# Altium schematic symbol library 场效应管.SchLib: 1062 symbols (part 3 of 4) (continued)
## MTP5P06V (continued)

## MTP6N60E
designator Q?
N-Channel MOSFET
simulation model MTP6N60E (SUBCKT)
pins: 1 D (in), 2 G (in), 3 S (in)
1 alternate drawing of the same symbol

## MTP6P20E
designator Q?
P-Channel MOSFET
simulation model MTP6P20E (SUBCKT)
pins: 1 D (in), 2 G (in), 3 S (in)
1 alternate drawing of the same symbol

## MTP7N20E
designator Q?
N-Channel MOSFET
simulation model MTP7N20E (SUBCKT)
pins: 1 D (in), 2 G (in), 3 S (in)
1 alternate drawing of the same symbol

## MTP8N50E
designator Q?
N-Channel MOSFET
simulation model MTP8N50E (SUBCKT)
pins: 1 D (in), 2 G (in), 3 S (in)
1 alternate drawing of the same symbol

## MTP9N25E
designator Q?
N-Channel MOSFET
simulation model MTP9N25E (SUBCKT)
pins: 1 D (in), 2 G (in), 3 S (in)
1 alternate drawing of the same symbol

## MTP10N10E
designator Q?
N-Channel MOSFET
simulation model MTP10N10E (SUBCKT)
pins: 1 D (in), 2 G (in), 3 S (in)
1 alternate drawing of the same symbol

## MTP10N10EL
designator Q?
N-Channel MOSFET
simulation model MTP10N10EL (SUBCKT)
pins: 1 D (in), 2 G (in), 3 S (in)
1 alternate drawing of the same symbol

## MTP10N40E
designator Q?
N-Channel MOSFET
simulation model MTP10N40E (SUBCKT)
pins: 1 D (in), 2 G (in), 3 S (in)
1 alternate drawing of the same symbol

## MTP12N10E
designator Q?
N-Channel MOSFET
simulation model MTP12N10E (SUBCKT)
pins: 1 D (in), 2 G (in), 3 S (in)
1 alternate drawing of the same symbol

## MTP12P10
designator Q?
P-Channel MOSFET
simulation model MTP12P10 (SUBCKT)
pins: 1 D (in), 2 G (in), 3 S (in)
1 alternate drawing of the same symbol

## MTP15N06V
designator Q?
N-Channel MOSFET
simulation model MTP15N06V (SUBCKT)
pins: 1 D (in), 2 G (in), 3 S (in)
1 alternate drawing of the same symbol

## MTP15N06VL
designator Q?
N-Channel MOSFET
simulation model MTP15N06VL (SUBCKT)
pins: 1 D (in), 2 G (in), 3 S (in)
1 alternate drawing of the same symbol

## MTP16N25E
designator Q?
N-Channel MOSFET
simulation model MTP16N25E (SUBCKT)
pins: 1 D (in), 2 G (in), 3 S (in)
1 alternate drawing of the same symbol

## MTP20N06V
designator Q?
N-Channel MOSFET
simulation model MTP20N06V (SUBCKT)
pins: 1 D (in), 2 G (in), 3 S (in)
1 alternate drawing of the same symbol

## MTP20N20E
designator Q?
N-Channel MOSFET
simulation model MTP20N20E (SUBCKT)
pins: 1 D (in), 2 G (in), 3 S (in)
1 alternate drawing of the same symbol

## MTP23P06V
designator Q?
P-Channel MOSFET
simulation model MTP23P06V (SUBCKT)
pins: 1 D (in), 2 G (in), 3 S (in)
1 alternate drawing of the same symbol

## MTP27N10E
designator Q?
N-Channel MOSFET
simulation model MTP27N10E (SUBCKT)
pins: 1 D (in), 2 G (in), 3 S (in)
1 alternate drawing of the same symbol

## MTP30N06VL
designator Q?
N-Channel MOSFET
simulation model MTP30N06VL (SUBCKT)
pins: 1 D (in), 2 G (in), 3 S (in)
1 alternate drawing of the same symbol

## MTP30P06V
designator Q?
P-Channel MOSFET
simulation model MTP30P06V (SUBCKT)
pins: 1 D (in), 2 G (in), 3 S (in)
1 alternate drawing of the same symbol

## MTP33N10E
designator Q?
N-Channel MOSFET
simulation model MTP33N10E (SUBCKT)
pins: 1 D (in), 2 G (in), 3 S (in)
1 alternate drawing of the same symbol

## MTP35N06ZL
designator Q?
N-Channel MOSFET
simulation model MTP35N06ZL (SUBCKT)
pins: 1 D (in), 2 G (in), 3 S (in)
1 alternate drawing of the same symbol

## MTP36N06V
designator Q?
N-Channel MOSFET
simulation model MTP36N06V (SUBCKT)
pins: 1 D (in), 2 G (in), 3 S (in)
1 alternate drawing of the same symbol

## MTP50P03HDL
designator Q?
P-Channel MOSFET
simulation model MTP50P03HDL (SUBCKT)
pins: 1 D (in), 2 G (in), 3 S (in)
1 alternate drawing of the same symbol

## MTP52N06V
designator Q?
N-Channel MOSFET
simulation model MTP52N06V (SUBCKT)
pins: 1 D (in), 2 G (in), 3 S (in)
1 alternate drawing of the same symbol

## MTP52N06VL
designator Q?
N-Channel MOSFET
simulation model MTP52N06VL (SUBCKT)
pins: 1 D (in), 2 G (in), 3 S (in)
1 alternate drawing of the same symbol

## MTP55N06Z
designator Q?
N-Channel MOSFET
simulation model MTP55N06Z (SUBCKT)
pins: 1 D (in), 2 G (in), 3 S (in)
1 alternate drawing of the same symbol

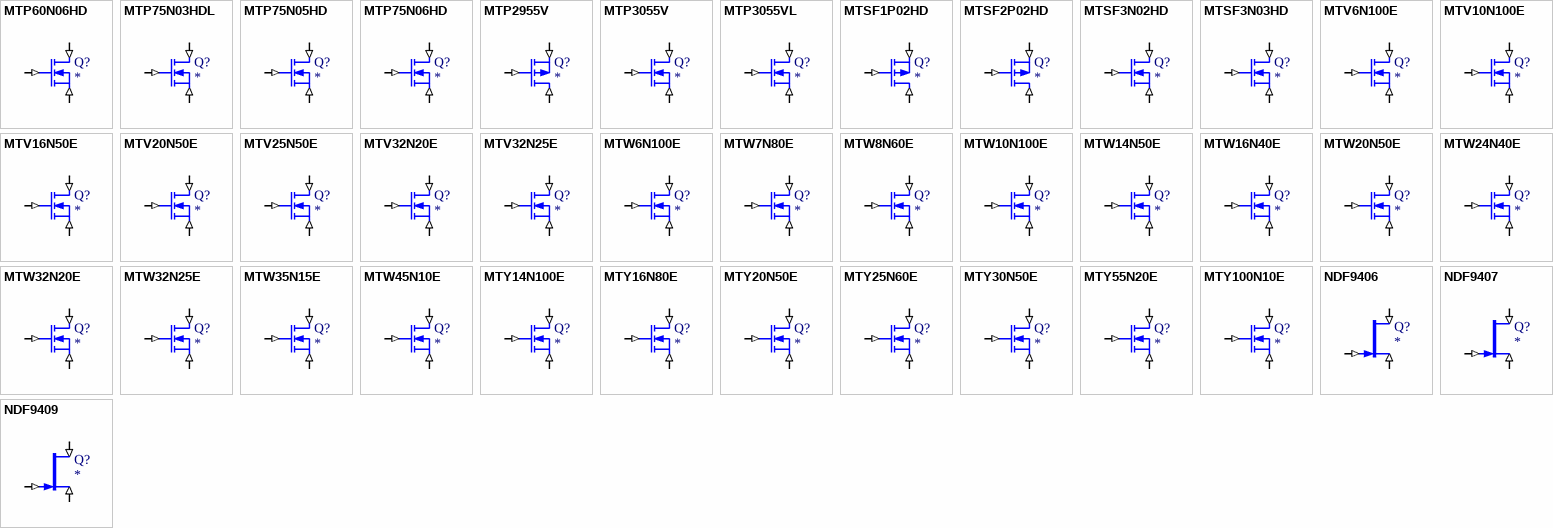
[diagram p21: symbols MTP60N06HD to NDF9409]

## MTP60N06HD
designator Q?
N-Channel MOSFET
simulation model MTP60N06HD (SUBCKT)
pins: 1 D (in), 2 G (in), 3 S (in)
1 alternate drawing of the same symbol

## MTP75N03HDL
designator Q?
N-Channel MOSFET
simulation model MTP75N03HDL (SUBCKT)
pins: 1 D (in), 2 G (in), 3 S (in)
1 alternate drawing of the same symbol

## MTP75N05HD
designator Q?
N-Channel MOSFET
simulation model MTP75N05HD (SUBCKT)
pins: 1 D (in), 2 G (in), 3 S (in)
1 alternate drawing of the same symbol

## MTP75N06HD
designator Q?
N-Channel MOSFET
simulation model MTP75N06HD (SUBCKT)
pins: 1 D (in), 2 G (in), 3 S (in)
1 alternate drawing of the same symbol

## MTP2955V
designator Q?
P-Channel MOSFET
simulation model MTP2955V (SUBCKT)
pins: 1 D (in), 2 G (in), 3 S (in)
1 alternate drawing of the same symbol

## MTP3055V
designator Q?
N-Channel MOSFET
simulation model MTP3055V (SUBCKT)
pins: 1 D (in), 2 G (in), 3 S (in)
1 alternate drawing of the same symbol

## MTP3055VL
designator Q?
N-Channel MOSFET
simulation model MTP3055VL (SUBCKT)
pins: 1 D (in), 2 G (in), 3 S (in)
1 alternate drawing of the same symbol

## MTSF1P02HD
designator Q?
P-Channel MOSFET
simulation model MTSF1P02HD (SUBCKT)
pins: 1 D (in), 2 G (in), 3 S (in)
1 alternate drawing of the same symbol

## MTSF2P02HD
designator Q?
P-Channel MOSFET
simulation model MTSF2P02HD (SUBCKT)
pins: 1 D (in), 2 G (in), 3 S (in)
1 alternate drawing of the same symbol

## MTSF3N02HD
designator Q?
N-Channel MOSFET
simulation model MTSF3N02HD (SUBCKT)
pins: 1 D (in), 2 G (in), 3 S (in)
1 alternate drawing of the same symbol

## MTSF3N03HD
designator Q?
N-Channel MOSFET
simulation model MTSF3N03HD (SUBCKT)
pins: 1 D (in), 2 G (in), 3 S (in)
1 alternate drawing of the same symbol

## MTV6N100E
designator Q?
N-Channel MOSFET
simulation model MTV6N100E (SUBCKT)
pins: 1 D (in), 2 G (in), 3 S (in)
1 alternate drawing of the same symbol

## MTV10N100E
designator Q?
N-Channel MOSFET
simulation model MTV10N100E (SUBCKT)
pins: 1 D (in), 2 G (in), 3 S (in)
1 alternate drawing of the same symbol

## MTV16N50E
designator Q?
N-Channel MOSFET
simulation model MTV16N50E (SUBCKT)
pins: 1 D (in), 2 G (in), 3 S (in)
1 alternate drawing of the same symbol

## MTV20N50E
designator Q?
N-Channel MOSFET
simulation model MTV20N50E (SUBCKT)
pins: 1 D (in), 2 G (in), 3 S (in)
1 alternate drawing of the same symbol

## MTV25N50E
designator Q?
N-Channel MOSFET
simulation model MTV25N50E (SUBCKT)
pins: 1 D (in), 2 G (in), 3 S (in)
1 alternate drawing of the same symbol

## MTV32N20E
designator Q?
N-Channel MOSFET
simulation model MTV32N20E (SUBCKT)
pins: 1 D (in), 2 G (in), 3 S (in)
1 alternate drawing of the same symbol

## MTV32N25E
designator Q?
N-Channel MOSFET
simulation model MTV32N25E (SUBCKT)
pins: 1 D (in), 2 G (in), 3 S (in)
1 alternate drawing of the same symbol

## MTW6N100E
designator Q?
N-Channel MOSFET
simulation model MTW6N100E (SUBCKT)
pins: 1 D (in), 2 G (in), 3 S (in)
1 alternate drawing of the same symbol

## MTW7N80E
designator Q?
N-Channel MOSFET
simulation model MTW7N80E (SUBCKT)
pins: 1 D (in), 2 G (in), 3 S (in)
1 alternate drawing of the same symbol

## MTW8N60E
designator Q?
N-Channel MOSFET
simulation model MTW8N60E (SUBCKT)
pins: 1 D (in), 2 G (in), 3 S (in)
1 alternate drawing of the same symbol

## MTW10N100E
designator Q?
N-Channel MOSFET
simulation model MTW10N100E (SUBCKT)
pins: 1 D (in), 2 G (in), 3 S (in)
1 alternate drawing of the same symbol

## MTW14N50E
designator Q?
N-Channel MOSFET
simulation model MTW14N50E (SUBCKT)
pins: 1 D (in), 2 G (in), 3 S (in)
1 alternate drawing of the same symbol

## MTW16N40E
designator Q?
N-Channel MOSFET
simulation model MTW16N40E (SUBCKT)
pins: 1 D (in), 2 G (in), 3 S (in)
1 alternate drawing of the same symbol

## MTW20N50E
designator Q?
N-Channel MOSFET
simulation model MTW20N50E (SUBCKT)
pins: 1 D (in), 2 G (in), 3 S (in)
1 alternate drawing of the same symbol

## MTW24N40E
designator Q?
N-Channel MOSFET
simulation model MTW24N40E (SUBCKT)
pins: 1 D (in), 2 G (in), 3 S (in)
1 alternate drawing of the same symbol

## MTW32N20E
designator Q?
N-Channel MOSFET
simulation model MTW32N20E (SUBCKT)
pins: 1 D (in), 2 G (in), 3 S (in)
1 alternate drawing of the same symbol

## MTW32N25E
designator Q?
N-Channel MOSFET
simulation model MTW32N25E (SUBCKT)
pins: 1 D (in), 2 G (in), 3 S (in)
1 alternate drawing of the same symbol

## MTW35N15E
designator Q?
N-Channel MOSFET
simulation model MTW35N15E (SUBCKT)
pins: 1 D (in), 2 G (in), 3 S (in)
1 alternate drawing of the same symbol

## MTW45N10E
designator Q?
N-Channel MOSFET
simulation model MTW45N10E (SUBCKT)
pins: 1 D (in), 2 G (in), 3 S (in)
1 alternate drawing of the same symbol

## MTY14N100E
designator Q?
N-Channel MOSFET
simulation model MTY14N100E (SUBCKT)
pins: 1 D (in), 2 G (in), 3 S (in)
1 alternate drawing of the same symbol

## MTY16N80E
designator Q?
N-Channel MOSFET
simulation model MTY16N80E (SUBCKT)
pins: 1 D (in), 2 G (in), 3 S (in)
1 alternate drawing of the same symbol

## MTY20N50E
designator Q?
N-Channel MOSFET
simulation model MTY20N50E (SUBCKT)
pins: 1 D (in), 2 G (in), 3 S (in)
1 alternate drawing of the same symbol

## MTY25N60E
designator Q?
N-Channel MOSFET
simulation model MTY25N60E (SUBCKT)
pins: 1 D (in), 2 G (in), 3 S (in)
1 alternate drawing of the same symbol

## MTY30N50E
designator Q?
N-Channel MOSFET
simulation model MTY30N50E (SUBCKT)
pins: 1 D (in), 2 G (in), 3 S (in)
1 alternate drawing of the same symbol

## MTY55N20E
designator Q?
N-Channel MOSFET
simulation model MTY55N20E (SUBCKT)
pins: 1 D (in), 2 G (in), 3 S (in)
1 alternate drawing of the same symbol

## MTY100N10E
designator Q?
N-Channel MOSFET
simulation model MTY100N10E (SUBCKT)
pins: 1 D (in), 2 G (in), 3 S (in)
1 alternate drawing of the same symbol

## NDF9406
designator Q?
N-Channel JFET
simulation model NDF9406 (NJFET)
pins: 1 D (in), 2 G (in), 3 S (in)
1 alternate drawing of the same symbol

## NDF9407
designator Q?
N-Channel JFET
simulation model NDF9407 (NJFET)
pins: 1 D (in), 2 G (in), 3 S (in)
1 alternate drawing of the same symbol

## NDF9409
designator Q?
N-Channel JFET
simulation model NDF9409 (NJFET)
pins: 1 D (in), 2 G (in), 3 S (in)
1 alternate drawing of the same symbol

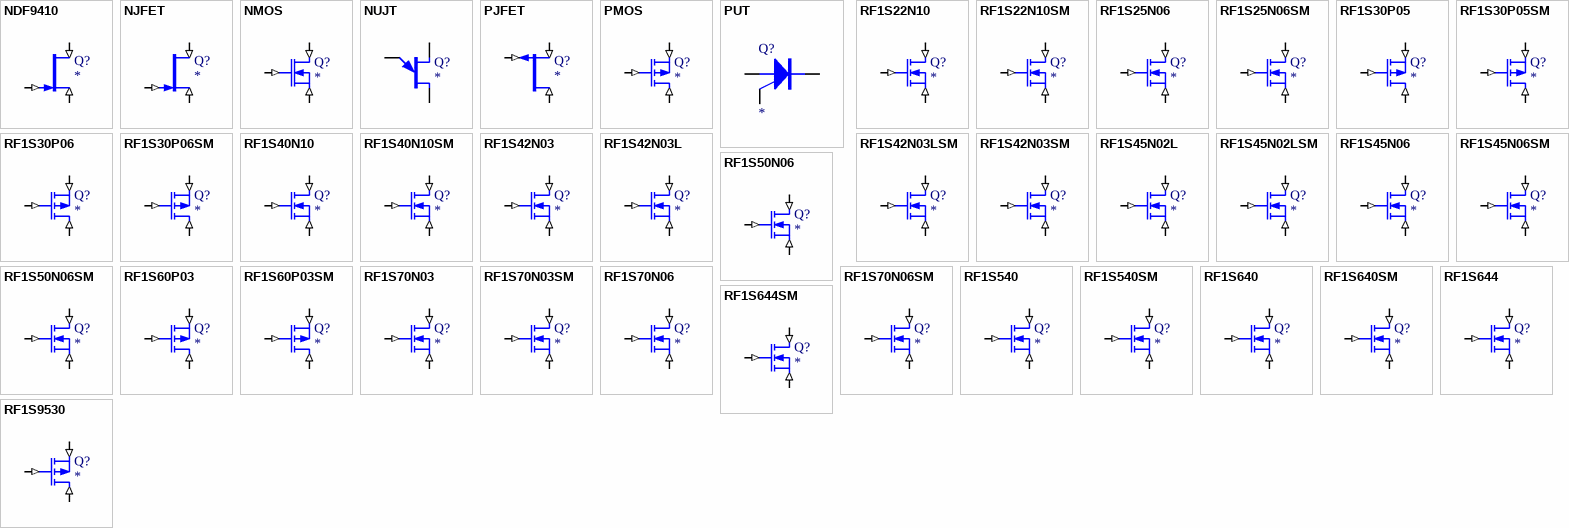
[diagram p22: symbols NDF9410 to RF1S9530]

## NDF9410
designator Q?
N-Channel JFET
simulation model NDF9410 (NJFET)
pins: 1 D (in), 2 G (in), 3 S (in)
1 alternate drawing of the same symbol

## NJFET
designator Q?
N-Channel JFET
simulation model NJFET
pins: 1 D (in), 2 G (in), 3 S (in)
1 alternate drawing of the same symbol

## NMOS
designator Q?
N-Channel MOSFET; TEMP: *
simulation model NMOS (NEMOS)
pins: 1 D (in), 2 G (in), 3 S (in)
1 alternate drawing of the same symbol

## NUJT
designator Q?
Unijunction Transistor
simulation model NUJT (SUBCKT)
pins: 1 B2, 2 E, 3 B1
1 alternate drawing of the same symbol

## PJFET
designator Q?
P-Channel JFET
simulation model PJFET
pins: 1 D (in), 2 G (in), 3 S (in)
1 alternate drawing of the same symbol

## PMOS
designator Q?
P-Channel MOSFET; TEMP: *
simulation model PMOS (PEMOS)
pins: 1 D (in), 2 G (in), 3 S (in)
1 alternate drawing of the same symbol

## PUT
designator Q?
Programmable Unijunction Transistor
simulation model PUT (SUBCKT)
pins: 1 A, 2 G, 3 K
1 alternate drawing of the same symbol

## RF1S22N10
designator Q?
N-Channel MOSFET
simulation model RF1S22N10 (SUBCKT)
pins: 1 D (in), 2 G (in), 3 S (in)
1 alternate drawing of the same symbol

## RF1S22N10SM
designator Q?
N-Channel MOSFET
simulation model RF1S22N10SM (SUBCKT)
pins: 1 D (in), 2 G (in), 3 S (in)
1 alternate drawing of the same symbol

## RF1S25N06
designator Q?
N-Channel MOSFET
simulation model RF1S25N06 (SUBCKT)
pins: 1 D (in), 2 G (in), 3 S (in)
1 alternate drawing of the same symbol

## RF1S25N06SM
designator Q?
N-Channel MOSFET
simulation model RF1S25N06SM (SUBCKT)
pins: 1 D (in), 2 G (in), 3 S (in)
1 alternate drawing of the same symbol

## RF1S30P05
designator Q?
P-Channel MOSFET
simulation model RF1S30P05 (SUBCKT)
pins: 1 D (in), 2 G (in), 3 S (in)
1 alternate drawing of the same symbol

## RF1S30P05SM
designator Q?
P-Channel MOSFET
simulation model RF1S30P05SM (SUBCKT)
pins: 1 D (in), 2 G (in), 3 S (in)
1 alternate drawing of the same symbol

## RF1S30P06
designator Q?
P-Channel MOSFET
simulation model RF1S30P06 (SUBCKT)
pins: 1 D (in), 2 G (in), 3 S (in)
1 alternate drawing of the same symbol

## RF1S30P06SM
designator Q?
P-Channel MOSFET
simulation model RF1S30P06SM (SUBCKT)
pins: 1 D (in), 2 G (in), 3 S (in)
1 alternate drawing of the same symbol

## RF1S40N10
designator Q?
N-Channel MOSFET
simulation model RF1S40N10 (SUBCKT)
pins: 1 D (in), 2 G (in), 3 S (in)
1 alternate drawing of the same symbol

## RF1S40N10SM
designator Q?
N-Channel MOSFET
simulation model RF1S40N10SM (SUBCKT)
pins: 1 D (in), 2 G (in), 3 S (in)
1 alternate drawing of the same symbol

## RF1S42N03
designator Q?
N-Channel MOSFET
simulation model RF1S42N03 (SUBCKT)
pins: 1 D (in), 2 G (in), 3 S (in)
1 alternate drawing of the same symbol

## RF1S42N03L
designator Q?
N-Channel MOSFET
simulation model RF1S42N03L (SUBCKT)
pins: 1 D (in), 2 G (in), 3 S (in)
1 alternate drawing of the same symbol

## RF1S42N03LSM
designator Q?
N-Channel MOSFET
simulation model RF1S42N03LSM (SUBCKT)
pins: 1 D (in), 2 G (in), 3 S (in)
1 alternate drawing of the same symbol

## RF1S42N03SM
designator Q?
N-Channel MOSFET
simulation model RF1S42N03SM (SUBCKT)
pins: 1 D (in), 2 G (in), 3 S (in)
1 alternate drawing of the same symbol

## RF1S45N02L
designator Q?
N-Channel MOSFET
simulation model RF1S45N02L (SUBCKT)
pins: 1 D (in), 2 G (in), 3 S (in)
1 alternate drawing of the same symbol

## RF1S45N02LSM
designator Q?
N-Channel MOSFET
simulation model RF1S45N02LSM (SUBCKT)
pins: 1 D (in), 2 G (in), 3 S (in)
1 alternate drawing of the same symbol

## RF1S45N06
designator Q?
N-Channel MOSFET
simulation model RF1S45N06 (SUBCKT)
pins: 1 D (in), 2 G (in), 3 S (in)
1 alternate drawing of the same symbol

## RF1S45N06SM
designator Q?
N-Channel MOSFET
simulation model RF1S45N06SM (SUBCKT)
pins: 1 D (in), 2 G (in), 3 S (in)
1 alternate drawing of the same symbol

## RF1S50N06
designator Q?
N-Channel MOSFET
simulation model RF1S50N06 (SUBCKT)
pins: 1 D (in), 2 G (in), 3 S (in)
1 alternate drawing of the same symbol

## RF1S50N06SM
designator Q?
N-Channel MOSFET
simulation model RF1S50N06SM (SUBCKT)
pins: 1 D (in), 2 G (in), 3 S (in)
1 alternate drawing of the same symbol

## RF1S60P03
designator Q?
P-Channel MOSFET
simulation model RF1S60P03 (SUBCKT)
pins: 1 D (in), 2 G (in), 3 S (in)
1 alternate drawing of the same symbol

## RF1S60P03SM
designator Q?
P-Channel MOSFET
simulation model RF1S60P03SM (SUBCKT)
pins: 1 D (in), 2 G (in), 3 S (in)
1 alternate drawing of the same symbol

## RF1S70N03
designator Q?
N-Channel MOSFET
simulation model RF1S70N03 (SUBCKT)
pins: 1 D (in), 2 G (in), 3 S (in)
1 alternate drawing of the same symbol

## RF1S70N03SM
designator Q?
N-Channel MOSFET
simulation model RF1S70N03SM (SUBCKT)
pins: 1 D (in), 2 G (in), 3 S (in)
1 alternate drawing of the same symbol

## RF1S70N06
designator Q?
N-Channel MOSFET
simulation model RF1S70N06 (SUBCKT)
pins: 1 D (in), 2 G (in), 3 S (in)
1 alternate drawing of the same symbol

## RF1S70N06SM
designator Q?
N-Channel MOSFET
simulation model RF1S70N06SM (SUBCKT)
pins: 1 D (in), 2 G (in), 3 S (in)
1 alternate drawing of the same symbol

## RF1S540
designator Q?
N-Channel MOSFET
simulation model RF1S540 (SUBCKT)
pins: 1 D (in), 2 G (in), 3 S (in)
1 alternate drawing of the same symbol

## RF1S540SM
designator Q?
N-Channel MOSFET
simulation model RF1S540SM (SUBCKT)
pins: 1 D (in), 2 G (in), 3 S (in)
1 alternate drawing of the same symbol

## RF1S640
designator Q?
N-Channel MOSFET
simulation model RF1S640 (SUBCKT)
pins: 1 D (in), 2 G (in), 3 S (in)
1 alternate drawing of the same symbol

## RF1S640SM
designator Q?
N-Channel MOSFET
simulation model RF1S640SM (SUBCKT)
pins: 1 D (in), 2 G (in), 3 S (in)
1 alternate drawing of the same symbol

## RF1S644
designator Q?
N-Channel MOSFET
simulation model RF1S644 (SUBCKT)
pins: 1 D (in), 2 G (in), 3 S (in)
1 alternate drawing of the same symbol

## RF1S644SM
designator Q?
N-Channel MOSFET
simulation model RF1S644SM (SUBCKT)
pins: 1 D (in), 2 G (in), 3 S (in)
1 alternate drawing of the same symbol

## RF1S9530
designator Q?
P-Channel MOSFET
simulation model RF1S9530 (SUBCKT)
pins: 1 D (in), 2 G (in), 3 S (in)
1 alternate drawing of the same symbol

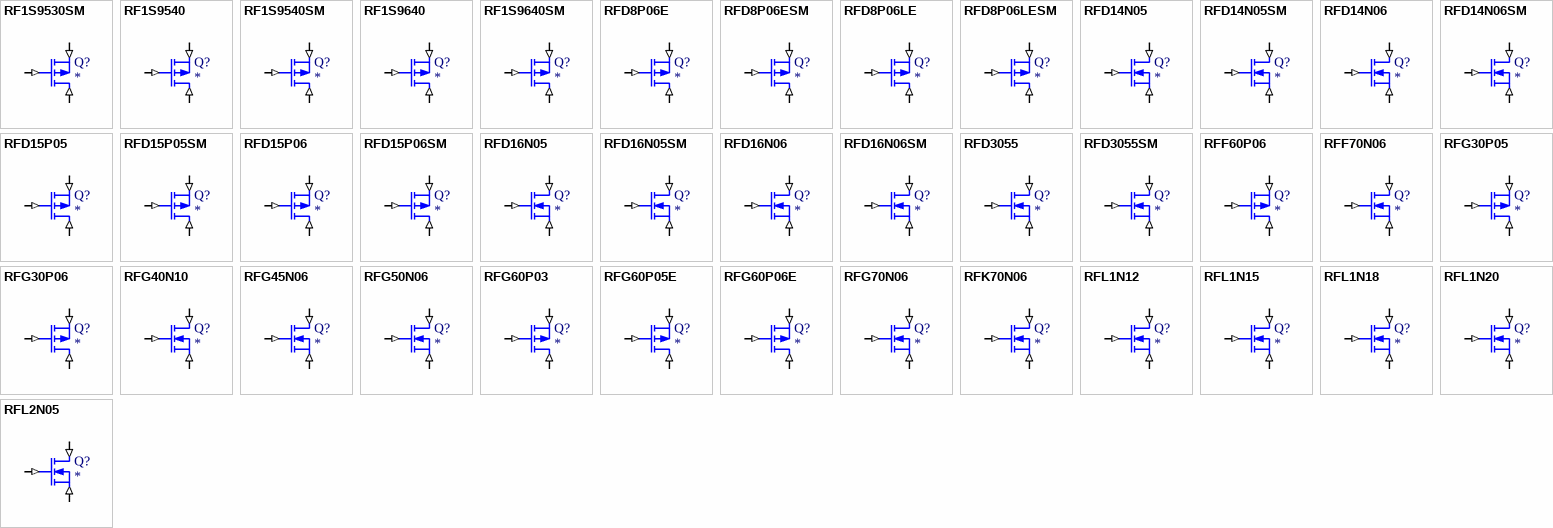
[diagram p23: symbols RF1S9530SM to RFL2N05]

## RF1S9530SM
designator Q?
P-Channel MOSFET
simulation model RF1S9530SM (SUBCKT)
pins: 1 D (in), 2 G (in), 3 S (in)
1 alternate drawing of the same symbol

## RF1S9540
designator Q?
P-Channel MOSFET
simulation model RF1S9540 (SUBCKT)
pins: 1 D (in), 2 G (in), 3 S (in)
1 alternate drawing of the same symbol

## RF1S9540SM
designator Q?
P-Channel MOSFET
simulation model RF1S9540SM (SUBCKT)
pins: 1 D (in), 2 G (in), 3 S (in)
1 alternate drawing of the same symbol

## RF1S9640
designator Q?
P-Channel MOSFET
simulation model RF1S9640 (SUBCKT)
pins: 1 D (in), 2 G (in), 3 S (in)
1 alternate drawing of the same symbol

## RF1S9640SM
designator Q?
P-Channel MOSFET
simulation model RF1S9640SM (SUBCKT)
pins: 1 D (in), 2 G (in), 3 S (in)
1 alternate drawing of the same symbol

## RFD8P06E
designator Q?
P-Channel MOSFET
simulation model RFD8P06E (SUBCKT)
pins: 1 D (in), 2 G (in), 3 S (in)
1 alternate drawing of the same symbol

## RFD8P06ESM
designator Q?
P-Channel MOSFET
simulation model RFD8P06ESM (SUBCKT)
pins: 1 D (in), 2 G (in), 3 S (in)
1 alternate drawing of the same symbol

## RFD8P06LE
designator Q?
P-Channel MOSFET
simulation model RFD8P06LE (SUBCKT)
pins: 1 D (in), 2 G (in), 3 S (in)
1 alternate drawing of the same symbol

## RFD8P06LESM
designator Q?
P-Channel MOSFET
simulation model RFD8P06LESM (SUBCKT)
pins: 1 D (in), 2 G (in), 3 S (in)
1 alternate drawing of the same symbol

## RFD14N05
designator Q?
N-Channel MOSFET
simulation model RFD14N05 (SUBCKT)
pins: 1 D (in), 2 G (in), 3 S (in)
1 alternate drawing of the same symbol

## RFD14N05SM
designator Q?
N-Channel MOSFET
simulation model RFD14N05SM (SUBCKT)
pins: 1 D (in), 2 G (in), 3 S (in)
1 alternate drawing of the same symbol

## RFD14N06
designator Q?
N-Channel MOSFET
simulation model RFD14N06 (SUBCKT)
pins: 1 D (in), 2 G (in), 3 S (in)
1 alternate drawing of the same symbol

## RFD14N06SM
designator Q?
N-Channel MOSFET
simulation model RFD14N06SM (SUBCKT)
pins: 1 D (in), 2 G (in), 3 S (in)
1 alternate drawing of the same symbol

## RFD15P05
designator Q?
P-Channel MOSFET
simulation model RFD15P05 (SUBCKT)
pins: 1 D (in), 2 G (in), 3 S (in)
1 alternate drawing of the same symbol

## RFD15P05SM
designator Q?
P-Channel MOSFET
simulation model RFD15P05SM (SUBCKT)
pins: 1 D (in), 2 G (in), 3 S (in)
1 alternate drawing of the same symbol

## RFD15P06
designator Q?
P-Channel MOSFET
simulation model RFD15P06 (SUBCKT)
pins: 1 D (in), 2 G (in), 3 S (in)
1 alternate drawing of the same symbol

## RFD15P06SM
designator Q?
P-Channel MOSFET
simulation model RFD15P06SM (SUBCKT)
pins: 1 D (in), 2 G (in), 3 S (in)
1 alternate drawing of the same symbol

## RFD16N05
designator Q?
N-Channel MOSFET
simulation model RFD16N05 (SUBCKT)
pins: 1 D (in), 2 G (in), 3 S (in)
1 alternate drawing of the same symbol

## RFD16N05SM
designator Q?
N-Channel MOSFET
simulation model RFD16N05SM (SUBCKT)
pins: 1 D (in), 2 G (in), 3 S (in)
1 alternate drawing of the same symbol

## RFD16N06
designator Q?
N-Channel MOSFET
simulation model RFD16N06 (SUBCKT)
pins: 1 D (in), 2 G (in), 3 S (in)
1 alternate drawing of the same symbol

## RFD16N06SM
designator Q?
N-Channel MOSFET
simulation model RFD16N06SM (SUBCKT)
pins: 1 D (in), 2 G (in), 3 S (in)
1 alternate drawing of the same symbol

## RFD3055
designator Q?
N-Channel MOSFET
simulation model RFD3055 (SUBCKT)
pins: 1 D (in), 2 G (in), 3 S (in)
1 alternate drawing of the same symbol

## RFD3055SM
designator Q?
N-Channel MOSFET
simulation model RFD3055SM (SUBCKT)
pins: 1 D (in), 2 G (in), 3 S (in)
1 alternate drawing of the same symbol

## RFF60P06
designator Q?
P-Channel MOSFET
simulation model RFF60P06 (SUBCKT)
pins: 1 D (in), 2 G (in), 3 S (in)
1 alternate drawing of the same symbol

## RFF70N06
designator Q?
N-Channel MOSFET
simulation model RFF70N06 (SUBCKT)
pins: 1 D (in), 2 G (in), 3 S (in)
1 alternate drawing of the same symbol

## RFG30P05
designator Q?
P-Channel MOSFET
simulation model RFG30P05 (SUBCKT)
pins: 1 D (in), 2 G (in), 3 S (in)
1 alternate drawing of the same symbol

## RFG30P06
designator Q?
P-Channel MOSFET
simulation model RFG30P06 (SUBCKT)
pins: 1 D (in), 2 G (in), 3 S (in)
1 alternate drawing of the same symbol

## RFG40N10
designator Q?
N-Channel MOSFET
simulation model RFG40N10 (SUBCKT)
pins: 1 D (in), 2 G (in), 3 S (in)
1 alternate drawing of the same symbol

## RFG45N06
designator Q?
N-Channel MOSFET
simulation model RFG45N06 (SUBCKT)
pins: 1 D (in), 2 G (in), 3 S (in)
1 alternate drawing of the same symbol

## RFG50N06
designator Q?
N-Channel MOSFET
simulation model RFG50N06 (SUBCKT)
pins: 1 D (in), 2 G (in), 3 S (in)
1 alternate drawing of the same symbol

## RFG60P03
designator Q?
P-Channel MOSFET
simulation model RFG60P03 (SUBCKT)
pins: 1 D (in), 2 G (in), 3 S (in)
1 alternate drawing of the same symbol

## RFG60P05E
designator Q?
P-Channel MOSFET
simulation model RFG60P05E (SUBCKT)
pins: 1 D (in), 2 G (in), 3 S (in)
1 alternate drawing of the same symbol

## RFG60P06E
designator Q?
P-Channel MOSFET
simulation model RFG60P06E (SUBCKT)
pins: 1 D (in), 2 G (in), 3 S (in)
1 alternate drawing of the same symbol

## RFG70N06
designator Q?
N-Channel MOSFET
simulation model RFG70N06 (SUBCKT)
pins: 1 D (in), 2 G (in), 3 S (in)
1 alternate drawing of the same symbol

## RFK70N06
designator Q?
N-Channel MOSFET
simulation model RFK70N06 (SUBCKT)
pins: 1 D (in), 2 G (in), 3 S (in)
1 alternate drawing of the same symbol

## RFL1N12
designator Q?
N-Channel MOSFET
simulation model RFL1N12 (SUBCKT)
pins: 1 D (in), 2 G (in), 3 S (in)
1 alternate drawing of the same symbol

## RFL1N15
designator Q?
N-Channel MOSFET
simulation model RFL1N15 (SUBCKT)
pins: 1 D (in), 2 G (in), 3 S (in)
1 alternate drawing of the same symbol

## RFL1N18
designator Q?
N-Channel MOSFET
simulation model RFL1N18 (SUBCKT)
pins: 1 D (in), 2 G (in), 3 S (in)
1 alternate drawing of the same symbol

## RFL1N20
designator Q?
N-Channel MOSFET
simulation model RFL1N20 (SUBCKT)
pins: 1 D (in), 2 G (in), 3 S (in)
1 alternate drawing of the same symbol

## RFL2N05
designator Q?
N-Channel MOSFET
simulation model RFL2N05 (SUBCKT)
pins: 1 D (in), 2 G (in), 3 S (in)
1 alternate drawing of the same symbol

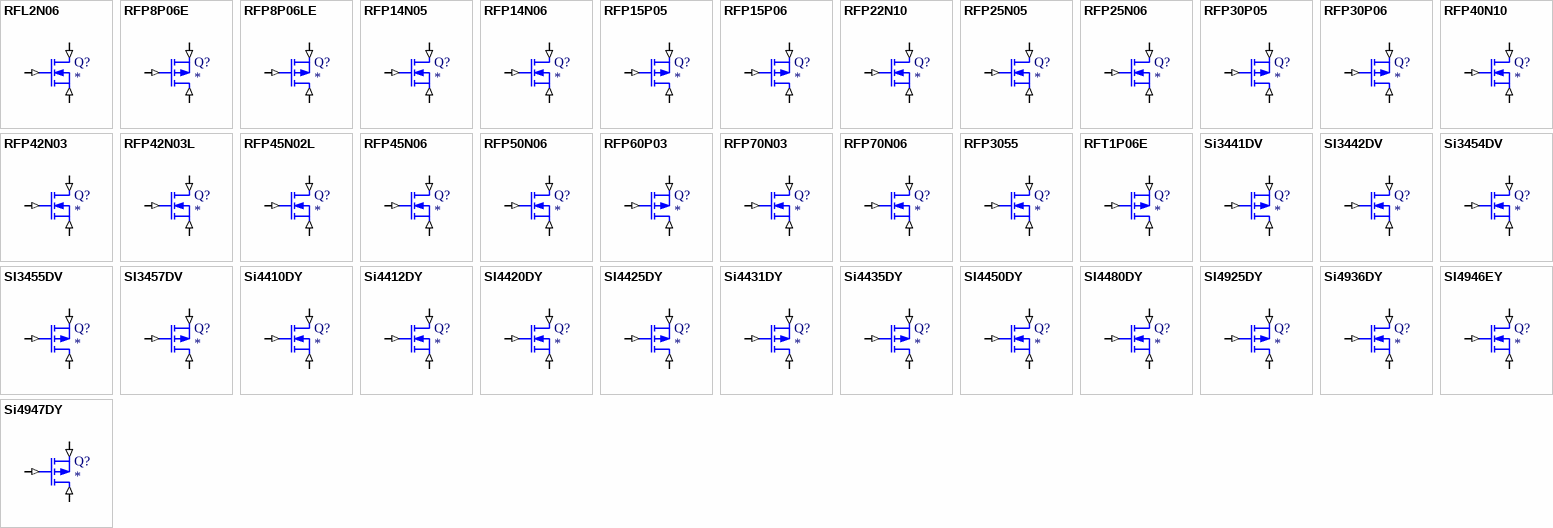
[diagram p24: symbols RFL2N06 to Si4947DY]

## RFL2N06
designator Q?
N-Channel MOSFET
simulation model RFL2N06 (SUBCKT)
pins: 1 D (in), 2 G (in), 3 S (in)
1 alternate drawing of the same symbol

## RFP8P06E
designator Q?
P-Channel MOSFET
simulation model RFP8P06E (SUBCKT)
pins: 1 D (in), 2 G (in), 3 S (in)
1 alternate drawing of the same symbol

## RFP8P06LE
designator Q?
P-Channel MOSFET
simulation model RFP8P06LE (SUBCKT)
pins: 1 D (in), 2 G (in), 3 S (in)
1 alternate drawing of the same symbol

## RFP14N05
designator Q?
N-Channel MOSFET
simulation model RFP14N05 (SUBCKT)
pins: 1 D (in), 2 G (in), 3 S (in)
1 alternate drawing of the same symbol

## RFP14N06
designator Q?
N-Channel MOSFET
simulation model RFP14N06 (SUBCKT)
pins: 1 D (in), 2 G (in), 3 S (in)
1 alternate drawing of the same symbol

## RFP15P05
designator Q?
P-Channel MOSFET
simulation model RFP15P05 (SUBCKT)
pins: 1 D (in), 2 G (in), 3 S (in)
1 alternate drawing of the same symbol

## RFP15P06
designator Q?
P-Channel MOSFET
simulation model RFP15P06 (SUBCKT)
pins: 1 D (in), 2 G (in), 3 S (in)
1 alternate drawing of the same symbol

## RFP22N10
designator Q?
N-Channel MOSFET
simulation model RFP22N10 (SUBCKT)
pins: 1 D (in), 2 G (in), 3 S (in)
1 alternate drawing of the same symbol

## RFP25N05
designator Q?
N-Channel MOSFET
simulation model RFP25N05 (SUBCKT)
pins: 1 D (in), 2 G (in), 3 S (in)
1 alternate drawing of the same symbol

## RFP25N06
designator Q?
N-Channel MOSFET
simulation model RFP25N06 (SUBCKT)
pins: 1 D (in), 2 G (in), 3 S (in)
1 alternate drawing of the same symbol

## RFP30P05
designator Q?
P-Channel MOSFET
simulation model RFP30P05 (SUBCKT)
pins: 1 D (in), 2 G (in), 3 S (in)
1 alternate drawing of the same symbol

## RFP30P06
designator Q?
P-Channel MOSFET
simulation model RFP30P06 (SUBCKT)
pins: 1 D (in), 2 G (in), 3 S (in)
1 alternate drawing of the same symbol

## RFP40N10
designator Q?
N-Channel MOSFET
simulation model RFP40N10 (SUBCKT)
pins: 1 D (in), 2 G (in), 3 S (in)
1 alternate drawing of the same symbol

## RFP42N03
designator Q?
N-Channel MOSFET
simulation model RFP42N03 (SUBCKT)
pins: 1 D (in), 2 G (in), 3 S (in)
1 alternate drawing of the same symbol

## RFP42N03L
designator Q?
N-Channel MOSFET
simulation model RFP42N03L (SUBCKT)
pins: 1 D (in), 2 G (in), 3 S (in)
1 alternate drawing of the same symbol

## RFP45N02L
designator Q?
N-Channel MOSFET
simulation model RFP45N02L (SUBCKT)
pins: 1 D (in), 2 G (in), 3 S (in)
1 alternate drawing of the same symbol

## RFP45N06
designator Q?
N-Channel MOSFET
simulation model RFP45N06 (SUBCKT)
pins: 1 D (in), 2 G (in), 3 S (in)
1 alternate drawing of the same symbol

## RFP50N06
designator Q?
N-Channel MOSFET
simulation model RFP50N06 (SUBCKT)
pins: 1 D (in), 2 G (in), 3 S (in)
1 alternate drawing of the same symbol

## RFP60P03
designator Q?
P-Channel MOSFET
simulation model RFP60P03 (SUBCKT)
pins: 1 D (in), 2 G (in), 3 S (in)
1 alternate drawing of the same symbol

## RFP70N03
designator Q?
N-Channel MOSFET
simulation model RFP70N03 (SUBCKT)
pins: 1 D (in), 2 G (in), 3 S (in)
1 alternate drawing of the same symbol

## RFP70N06
designator Q?
N-Channel MOSFET
simulation model RFP70N06 (SUBCKT)
pins: 1 D (in), 2 G (in), 3 S (in)
1 alternate drawing of the same symbol